# Altium footprint library 2228_AlarmeFenetre_Footprints.PcbLib: 25 footprints (part 2 of 2)
Each footprint in its own frame and in the unit in brackets; x right, y up, seen from the top. Pads: shape width x height; smd on the part's side, far side on the other; paste and mask are expansions set on the pad; w line width, h text height; cw(c..) or ccw(c..) is an arc to the next point about the centre after c.
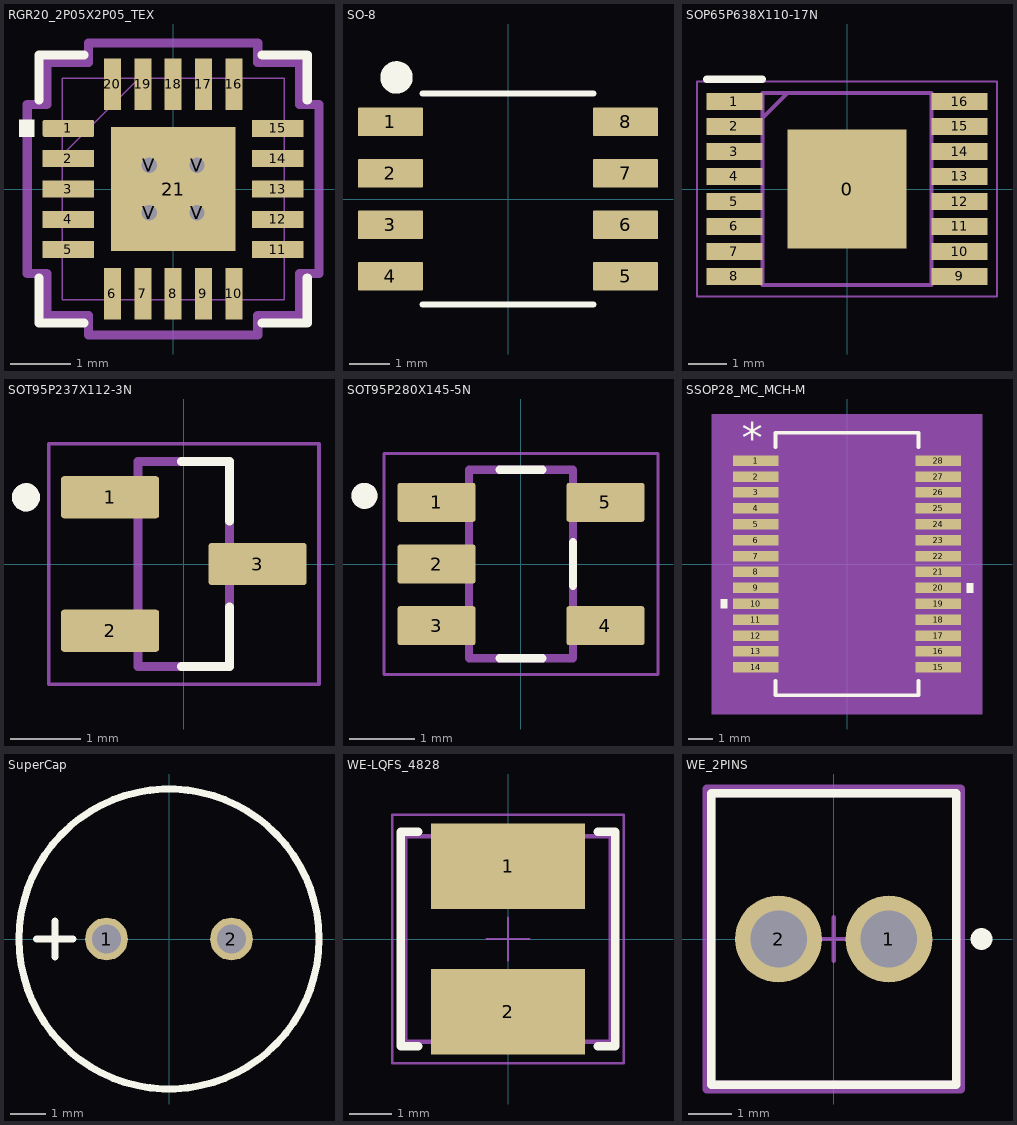
[diagram p1: the footprints below, top view; thin cyan lines are the x and y axes]

## RGR20_2P05X2P05_TEX [mm]
pads (25):
  rrect20% 0.85x0.28 smd paste+0 mask+0: 1(-1.725,1)
  rect 0.85x0.28 smd paste+0 mask+0: 2(-1.725,0.5) 3(-1.725,0) 4(-1.725,-0.5) 5(-1.725,-1) 11(1.725,-1) 12(1.725,-0.5) 13(1.725,0) 14(1.725,0.5) 15(1.725,1)
  rect 0.28x0.85 smd paste+0 mask+0: 6(-1,-1.725) 7(-0.5,-1.725) 8(0,-1.725) 9(0.5,-1.725) 10(1,-1.725) 16(1,1.725) 17(0.5,1.725) 18(0,1.725) 19(-0.5,1.725) 20(-1,1.725)
  rect 2.05x2.05 smd paste-1.025 mask-1.016: 21(0,0)
  round 0.508 hole 0.254: V(-0.394,-0.394) V(-0.394,0.394) V(0.394,-0.394) V(0.394,0.394)
Top Overlay:
  region: -2.286,1.143 -2.286,0.864 -2.54,0.864 -2.54,1.143
  lines w0.152: -2.21,-1.467 -2.21,-2.21 -1.468,-2.21 ; -2.21,1.467 -2.21,2.21 -1.468,2.21 ; 1.468,-2.21 2.21,-2.21 2.21,-1.467 ; 1.468,2.21 2.21,2.21 2.21,1.467
Top Paste:
  region: -0.494,0.95 -0.95,0.95 -0.95,0.494 -0.635,0.494 -0.494,0.635
  region: -0.635,0.294 -0.95,0.294 -0.95,-0.294 -0.635,-0.294 -0.494,-0.152 -0.494,0.152
  region: -0.635,-0.494 -0.95,-0.494 -0.95,-0.95 -0.494,-0.95 -0.494,-0.635
  region: 0.294,0.95 -0.294,0.95 -0.294,0.635 -0.152,0.494 0.152,0.494 0.294,0.635
  region: 0.152,0.294 -0.152,0.294 -0.294,0.152 -0.294,-0.152 -0.152,-0.294 0.152,-0.294 0.294,-0.152 0.294,0.152
  region: 0.152,-0.494 -0.152,-0.494 -0.294,-0.635 -0.294,-0.95 0.294,-0.95 0.294,-0.635
  region: 0.95,0.95 0.494,0.95 0.494,0.635 0.635,0.494 0.95,0.494
  region: 0.95,0.294 0.635,0.294 0.494,0.152 0.494,-0.152 0.635,-0.294 0.95,-0.294
  region: 0.95,-0.494 0.635,-0.494 0.494,-0.635 0.494,-0.95 0.95,-0.95
Top Solder:
  region: -1.088,0.594 -1.088,1.088 1.088,1.088 1.088,0.594
  region: -1.088,-0.194 -1.088,0.194 1.088,0.194 1.088,-0.194
  region: -1.088,-1.088 -1.088,-0.594 1.088,-0.594 1.088,-1.088
  region: -1.088,-1.088 -1.088,1.088 -0.594,1.088 -0.594,-1.088
  region: 0.194,-1.088 0.194,1.088 -0.194,1.088 -0.194,-1.088
  region: 0.594,-1.088 0.594,1.088 1.088,1.088 1.088,-1.088
Mechanical 13:
  lines w0.025: -1.829,0.559 -0.559,1.829 ; -1.829,-1.829 1.829,-1.829 1.829,1.829 -1.829,1.829 -1.829,-1.829
Mechanical 15:
  lines w0.152: -2.404,-1.394 -2.083,-1.394 -2.083,-2.083 -1.394,-2.083 -1.394,-2.404 1.394,-2.404 1.394,-2.083 2.083,-2.083 2.083,-1.394 2.404,-1.394 2.404,1.394 2.083,1.394 2.083,2.083 1.394,2.083 1.394,2.404 -1.394,2.404 -1.394,2.083 -2.083,2.083 -2.083,1.394 -2.404,1.394 -2.404,-1.394
3D body "RGR20_2P05X2P05_TEX.step": height 1.4, standoff 0, extent -1.88,-1.88 1.88,1.88

## SO-8 [mm]
height 1.5
pads (8):
  rrect5% 1.6x0.7 smd: 1(-2.9,1.905) 2(-2.9,0.635) 3(-2.9,-0.635) 4(-2.9,-1.905) 5(2.9,-1.905) 6(2.9,-0.635) 7(2.9,0.635) 8(2.9,1.905)
Top Overlay:
  circle w0.4: c-2.75,3 r0.2
  lines w0.152: -2.108,-2.603 2.108,-2.603 ; -2.108,2.603 2.108,2.603
3D body "IC_DMP3028LSD-13_DIO.step": height 1.76, standoff 0, extent -3.05,-2.476 3.05,2.476

## SOP65P638X110-17N [mm]
pads (17):
  rect 3.1x3.1 smd: 0(0,0)
  rect 1.45x0.45 smd: 1(-2.925,2.275) 2(-2.925,1.625) 3(-2.925,0.975) 4(-2.925,0.325) 5(-2.925,-0.325) 6(-2.925,-0.975) 7(-2.925,-1.625) 8(-2.925,-2.275) 9(2.925,-2.275) 10(2.925,-1.625) 11(2.925,-0.975) 12(2.925,-0.325) 13(2.925,0.325) 14(2.925,0.975) 15(2.925,1.625) 16(2.925,2.275)
Top Overlay:
  lines w0.2: -3.65,2.85 -2.2,2.85
Mechanical 15:
  lines w0.1: -2.2,1.85 -1.55,2.5 ; -2.2,-2.5 2.2,-2.5 2.2,2.5 -2.2,2.5 -2.2,-2.5
Mechanical 20:
  lines w0.05: -3.9,-2.8 3.9,-2.8 3.9,2.8 -3.9,2.8 -3.9,-2.8
3D body "MAX1793EUE33+.stp": height 1.1, standoff 0, extent -3.187,-2.5 3.187,2.5

## SOT95P237X112-3N [mm]
pads (3):
  rrect15% 1.4x0.6 smd: 1(-1.05,0.95) 2(-1.05,-0.95) 3(1.05,0)
Top Overlay:
  circle w0.2: c-2.246,0.95 r0.1
  lines w0.127: -0.035,-1.46 0.65,-1.46 0.65,-0.615 ; -0.035,1.46 0.65,1.46 0.65,0.615
Mechanical 13:
  circle w0.2: c-2.246,0.95 r0.1
  lines w0.127: -0.65,-1.46 -0.65,1.46 0.65,1.46 0.65,-1.46 -0.65,-1.46
Mechanical 15:
  lines w0.05: -1.925,-1.71 -1.925,1.71 1.925,1.71 1.925,-1.71 -1.925,-1.71
3D body "step_temp.STEP": height 1.12, standoff 0, extent -1.255,-1.46 1.255,1.46

## SOT95P280X145-5N [mm]
pads (5):
  rrect12% 1.2x0.6 smd: 1(-1.3,0.95) 2(-1.3,0) 3(-1.3,-0.95) 4(1.3,-0.95) 5(1.3,0.95)
Top Overlay:
  circle w0.2: c-2.41,1.05 r0.1
  lines w0.127: -0.33,-1.45 0.33,-1.45 ; -0.33,1.45 0.33,1.45 ; 0.8,-0.335 0.8,0.335
Mechanical 13:
  circle w0.2: c-2.41,1.05 r0.1
  lines w0.127: -0.8,-1.45 -0.8,1.45 0.8,1.45 0.8,-1.45 -0.8,-1.45
Mechanical 15:
  lines w0.05: -2.11,-1.7 2.11,-1.7 2.11,1.7 -2.11,1.7 -2.11,-1.7
3D body "step_temp.STEP": height 1.45, standoff 0, extent -1.4,-1.45 1.4,1.45

## SSOP28_MC_MCH-M [mm]
pads (28):
  rect 1.858x0.431 smd paste+0 mask+0: 1(-3.723,4.225) 2(-3.723,3.575) 3(-3.723,2.925) 4(-3.723,2.275) 5(-3.723,1.625) 6(-3.723,0.975) 7(-3.723,0.325) 8(-3.723,-0.325) 9(-3.723,-0.975) 10(-3.723,-1.625) 11(-3.723,-2.275) 12(-3.723,-2.925) 13(-3.723,-3.575) 14(-3.723,-4.225) 15(3.723,-4.225) 16(3.723,-3.575) 17(3.723,-2.925) 18(3.723,-2.275) 19(3.723,-1.625) 20(3.723,-0.975) 21(3.723,-0.325) 22(3.723,0.325) 23(3.723,0.975) 24(3.723,1.625) 25(3.723,2.275) 26(3.723,2.925) 27(3.723,3.575) 28(3.723,4.225)
Top Overlay:
  region: 4.906,-0.784 5.16,-0.784 5.16,-1.165 4.906,-1.165
  region: -4.906,-1.434 -5.16,-1.434 -5.16,-1.815 -4.906,-1.815
  lines w0.152: -2.921,-4.773 -2.921,-5.372 2.921,-5.372 2.921,-4.773 ; -2.921,4.773 -2.921,5.372 2.921,5.372 2.921,4.773
  text "*" at -4.295,4.529 h1.27
Mechanical 5:
  region: 5.541,-6.134 -5.541,-6.134 -5.541,6.134 5.541,6.134
Mechanical 13:
  lines w0: -0.305,5.245 ccw(c0,5.245) 0.305,5.245
  lines w0.025: -4.102,-4.415 -2.794,-4.415 -2.794,-4.034 -4.102,-4.034 -4.102,-4.415 ; -4.102,-3.765 -2.794,-3.765 -2.794,-3.384 -4.102,-3.384 -4.102,-3.765 ; -4.102,-3.115 -2.794,-3.115 -2.794,-2.734 -4.102,-2.734 -4.102,-3.115 ; -4.102,-2.465 -2.794,-2.465 -2.794,-2.084 -4.102,-2.084 -4.102,-2.465 ; -4.102,-1.815 -2.794,-1.815 -2.794,-1.434 -4.102,-1.434 -4.102,-1.815 ; -4.102,-1.165 -2.794,-1.165 -2.794,-0.784 -4.102,-0.784 -4.102,-1.165 ; -4.102,-0.515 -2.794,-0.515 -2.794,-0.134 -4.102,-0.134 -4.102,-0.515 ; -4.102,0.135 -2.794,0.135 -2.794,0.516 -4.102,0.516 -4.102,0.135 ; -4.102,0.784 -2.794,0.784 -2.794,1.165 -4.102,1.165 -4.102,0.784 ; -4.102,1.435 -2.794,1.435 -2.794,1.816 -4.102,1.816 -4.102,1.435 ; -4.102,2.084 -2.794,2.084 -2.794,2.465 -4.102,2.465 -4.102,2.084 ; -4.102,2.735 -2.794,2.735 -2.794,3.116 -4.102,3.116 -4.102,2.735 ; -4.102,3.384 -2.794,3.384 -2.794,3.765 -4.102,3.765 -4.102,3.384 ; -4.102,4.035 -2.794,4.035 -2.794,4.416 -4.102,4.416 -4.102,4.035 ; -2.794,-5.245 -2.794,5.245 2.794,5.245 2.794,-5.245 -2.794,-5.245 ; 2.794,-4.416 4.102,-4.416 4.102,-4.035 2.794,-4.035 2.794,-4.416 ; 2.794,-3.765 4.102,-3.765 4.102,-3.384 2.794,-3.384 2.794,-3.765 ; 2.794,-3.116 4.102,-3.116 4.102,-2.735 2.794,-2.735 2.794,-3.116 ; 2.794,-2.465 4.102,-2.465 4.102,-2.084 2.794,-2.084 2.794,-2.465 ; 2.794,-1.816 4.102,-1.816 4.102,-1.435 2.794,-1.435 2.794,-1.816 ; 2.794,-1.165 4.102,-1.165 4.102,-0.784 2.794,-0.784 2.794,-1.165 ; 2.794,-0.516 4.102,-0.516 4.102,-0.135 2.794,-0.135 2.794,-0.516 ; 2.794,0.135 4.102,0.135 4.102,0.516 2.794,0.516 2.794,0.135 ; 2.794,0.784 4.102,0.784 4.102,1.165 2.794,1.165 2.794,0.784 ; 2.794,1.435 4.102,1.435 4.102,1.816 2.794,1.816 2.794,1.435 ; 2.794,2.084 4.102,2.084 4.102,2.465 2.794,2.465 2.794,2.084 ; 2.794,2.735 4.102,2.735 4.102,3.116 2.794,3.116 2.794,2.735 ; 2.794,3.384 4.102,3.384 4.102,3.765 2.794,3.765 2.794,3.384 ; 2.794,4.035 4.102,4.035 4.102,4.416 2.794,4.416 2.794,4.035
  text "*" at -2.73,3.899 h1.27
Mechanical 15:
  region: -3.302,-4.948 -5.16,-4.948 -5.16,4.948 -3.302,4.948 -3.302,5.753 3.302,5.753 3.302,4.948 5.16,4.948 5.16,-4.948 3.302,-4.948 3.302,-5.753 -3.302,-5.753
  lines w0.152: -5.16,-4.948 -3.302,-4.948 -3.302,-5.753 3.302,-5.753 3.302,-4.948 5.16,-4.948 5.16,4.948 3.302,4.948 3.302,5.753 -3.302,5.753 -3.302,4.948 -5.16,4.948 -5.16,-4.948
3D body "SSOP28_MC_MCH.step": height 2.01, standoff 0, extent -4.102,-5.245 4.102,5.245

## SuperCap [mm]
pads (2):
  round 1.2 hole 0.8: 1(-1.75,0) 2(1.75,0)
Top Overlay:
  circle w0.2: c0,0 r4.2
  lines w0.2: -3.702,0 -2.686,0 ; -3.194,-0.508 -3.194,0.508
3D body "220uF 35V electr 8 x16mm -P.diameter 4mm.stp": height 16, standoff -4.1, extent -4,-4 4,4

## WE-LQFS_4828 [mm] "SMT Power Inductor, body 4.8x4.8mm"
height 2.8
pads (2):
  rect 3.6x2 smd: 1(0,1.7) 2(0,-1.7)
Top Overlay:
  lines w0.2: -2.1,-2.5 -2.5,-2.5 -2.5,2.5 -2.1,2.5 ; 2.1,-2.5 2.5,-2.5 2.5,2.5 2.1,2.5
Top 3D Body:
  lines w0.1: -2.4,-2.4 2.4,-2.4 2.4,2.4 -2.4,2.4 -2.4,-2.4
Top Courtyard:
  lines w0.05: -0.5,0 0.5,0 ; 0,-0.5 0,0.5 ; -2.7,-2.9 -2.7,2.9 2.7,2.9 2.7,-2.9 -2.7,-2.9
Top Component Outline:
  lines w0.1: -2.4,-2.4 2.4,-2.4 2.4,2.4 -2.4,2.4 -2.4,-2.4
3D body "4828_74406043.stp": height 2.8, standoff 0, extent -2.4,-2.4 2.4,2.4

## WE_2PINS [mm]
pads (2):
  round 2 hole 1.3 paste-1000 mask+0: 1(1.27,0) 2(-1.27,0)
Top Overlay:
  circle w0.25: c3.4,0 r0.125
  lines w0.2: -2.815,-3.35 -2.815,3.35 2.815,3.35 2.815,-3.35 -2.815,-3.35
Mechanical 10:
  lines w0.2: -2.915,-3.45 -2.915,3.45 2.915,3.45 2.915,-3.45 -2.915,-3.45
Mechanical 12:
  lines w0.2: -2.815,-3.35 -2.815,3.35 2.815,3.35 2.815,-3.35 -2.815,-3.35
Mechanical 15:
  lines w0.1: -0.5,0 0.5,0 ; 0,-0.5 0,0.5
  lines w0.2: -2.915,-3.45 -2.915,3.45 2.915,3.45 2.915,-3.45 -2.915,-3.45
3D body "Conn_Würth_Elektronik_691210910002_eec.STEP": height 0.25, standoff 0, extent -2.915,-3.45 2.915,3.45